# Altium footprint library ICs And Semiconductors THD.PcbLib: 507 footprints (part 8 of 32)
Each footprint in its own frame and in the unit in brackets; x right, y up, seen from the top. Pads: shape width x height; smd on the part's side, far side on the other; paste and mask are expansions set on the pad; w line width, h text height; cw(c..) or ccw(c..) is an arc to the next point about the centre after c.
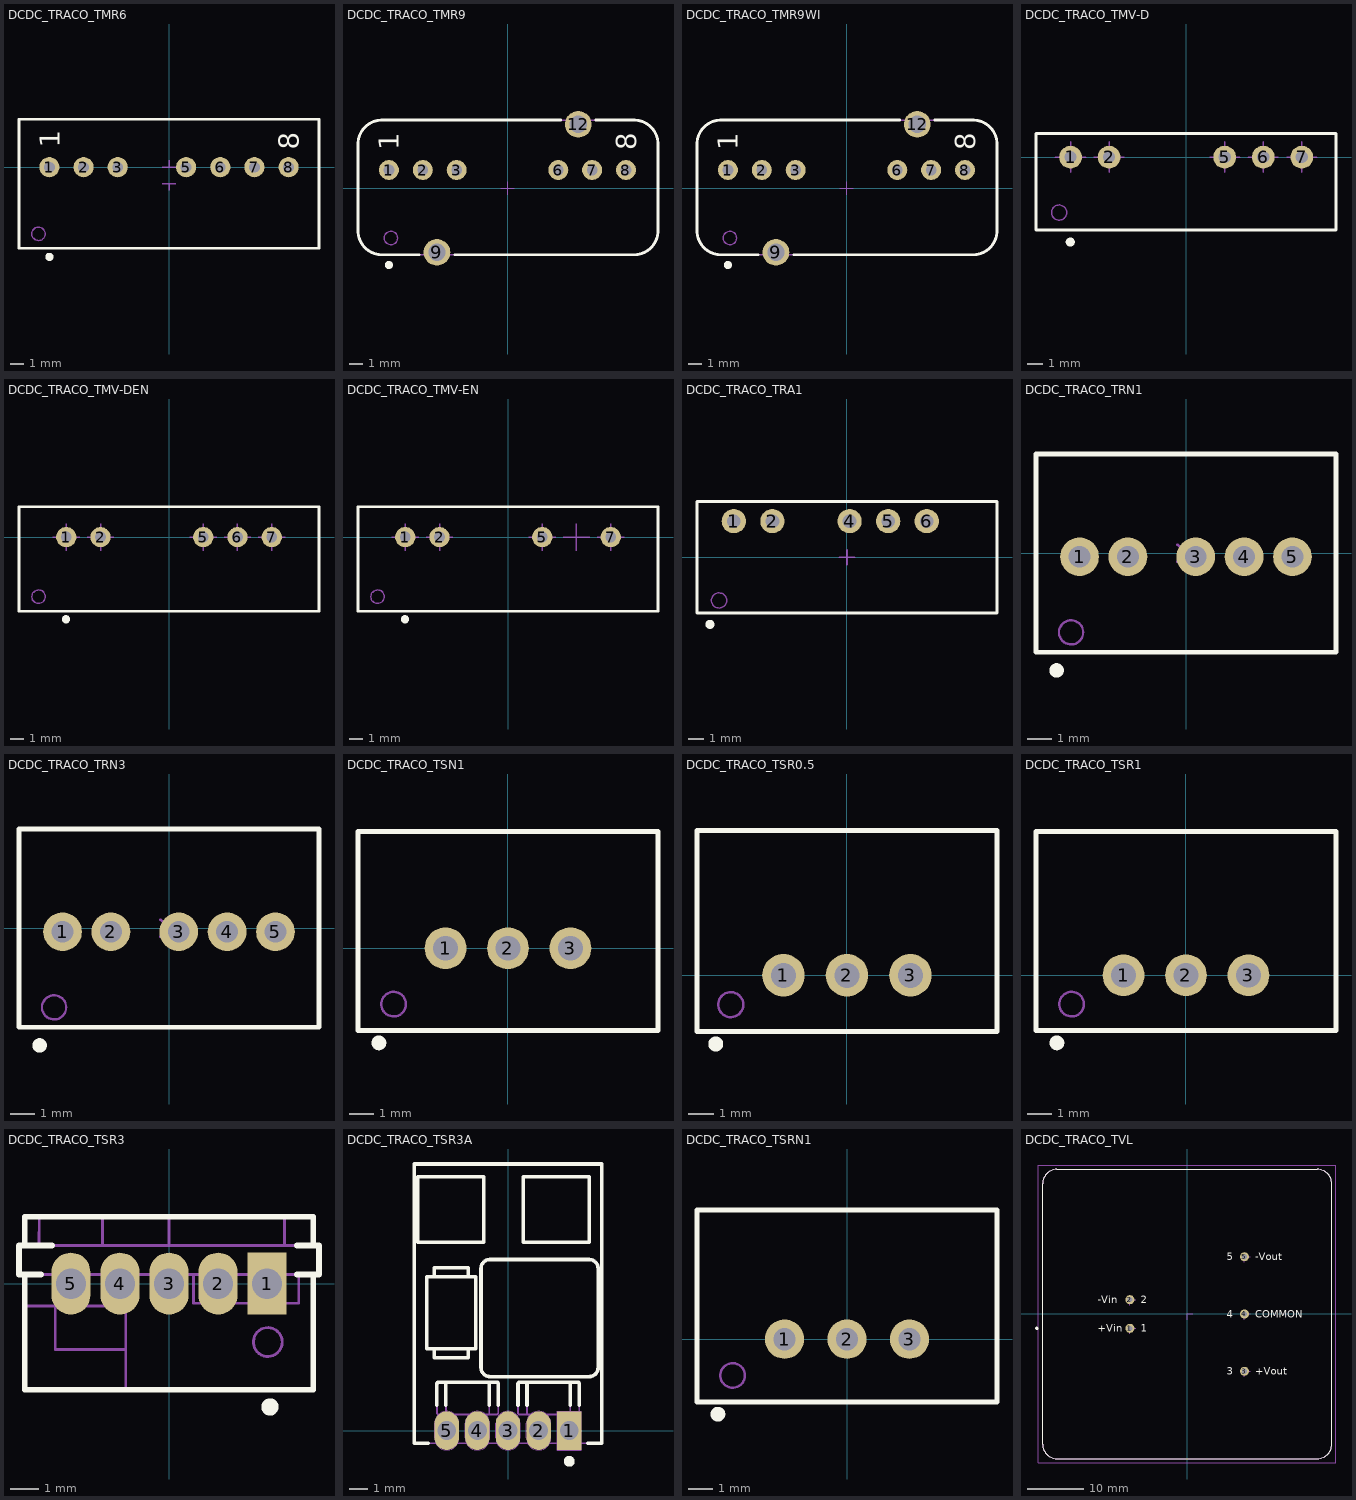
[diagram p7: the footprints below, top view; thin cyan lines are the x and y axes]

## DCDC_TRACO_TMR6 [mm] "TMR 6 Series , Body 21.8x9.1mm, Compact SIP-8 Package"
height 11.2
pads (7):
  round 1.5 hole 0.8: 1(-8.89,0) 2(-6.35,0) 3(-3.81,0) 5(1.27,0) 6(3.81,0) 7(6.35,0) 8(8.89,0)
Top Overlay:
  circle w0.3: c-8.89,-6.667 r0.15
  lines w0.2: -11.15,-6.025 11.15,-6.025 11.15,3.575 -11.15,3.575 -11.15,-6.025
  text "1" at -8.115,1.45 h1.5
  text "8" at 9.64,1.3 h1.5
Notvisible:
  lines w0.1: -9.39,0 -8.89,0 ; -8.89,-0.5 -8.89,0 ; -8.89,0.5 -8.89,0 ; -8.39,0 -8.89,0 ; -6.85,0 -6.35,0 ; -6.35,-0.5 -6.35,0 ; -6.35,0.5 -6.35,0 ; -5.85,0 -6.35,0 ; -4.31,0 -3.81,0 ; -3.81,-0.5 -3.81,0 ; -3.81,0.5 -3.81,0 ; -3.31,0 -3.81,0 ; -0.5,-1.225 0,-1.225 ; -0.5,0 0,0 ; 0,-1.725 0,-1.225 ; 0,0.5 0,0 ; 0.5,-1.225 0,-1.225 ; 0.5,0 0,0 ; 0.77,0 1.27,0 ; 1.27,-0.5 1.27,0 ; 1.27,0.5 1.27,0 ; 1.77,0 1.27,0 ; 3.31,0 3.81,0 ; 3.81,-0.5 3.81,0 ; 3.81,0.5 3.81,0 ; 4.31,0 3.81,0 ; 5.85,0 6.35,0 ; 6.35,-0.5 6.35,0 ; 6.35,0.5 6.35,0 ; 6.85,0 6.35,0 ; 8.39,0 8.89,0 ; 8.89,-0.5 8.89,0 ; 8.89,0.5 8.89,0 ; 9.39,0 8.89,0
  text "2" at -5.6,1.2 h1.5
  text "7" at 7.1,1.2 h1.5
  text "6" at 4.56,1.2 h1.5
  text "5" at 2.02,1.2 h1.5
  text "3" at -3.06,1.2 h1.5
Mechanical 14:
  circle w0.1: c-9.7,-4.95 r0.5
  lines w0.1: -11.15,-6.025 11.15,-6.025 11.15,3.575 -11.15,3.575 -11.15,-6.025
  text "1" at -8.115,1.45 h1.5
  text "8" at 9.64,1.3 h1.5
3D body "DCDC_TRACO_TMR6.stp": height 11.7, standoff -3.6, extent -11.15,-6.025 11.15,3.575

## DCDC_TRACO_TMR9 [mm] "TMR 9 Series, Body 21.8x9.6mm, Compact SIP-8 Package"
height 11.7
pads (8):
  round 1.5 hole 0.8: 1(-8.9,1.375) 2(-6.36,1.375) 3(-3.82,1.375) 6(3.8,1.375) 7(6.34,1.375) 8(8.88,1.375)
  round 2 hole 1.3: 9(-5.3,-4.8) 12(5.3,4.8)
Top Overlay:
  drawing of 407 lines, arcs and shapes, not listed
  text "1" at -8.15,2.875 h1.5
  text "8" at 9.63,2.875 h1.5
Notvisible:
  lines w0.05: -9.4,1.375 -8.9,1.375 ; -8.9,0.875 -8.9,1.375 ; -8.9,1.875 -8.9,1.375 ; -8.4,1.375 -8.9,1.375 ; -6.86,1.375 -6.36,1.375 ; -6.36,0.875 -6.36,1.375 ; -6.36,1.875 -6.36,1.375 ; -5.86,1.375 -6.36,1.375 ; -5.8,-4.8 -5.3,-4.8 ; -5.3,-5.3 -5.3,-4.8 ; -5.3,-4.3 -5.3,-4.8 ; -4.8,-4.8 -5.3,-4.8 ; -4.32,1.375 -3.82,1.375 ; -3.82,0.875 -3.82,1.375 ; -3.82,1.875 -3.82,1.375 ; -3.32,1.375 -3.82,1.375 ; -0.5,0 0,0 ; 0,-0.5 0,0 ; 0,0.5 0,0 ; 0.5,0 0,0 ; 3.3,1.375 3.8,1.375 ; 3.8,0.875 3.8,1.375 ; 3.8,1.875 3.8,1.375 ; 4.3,1.375 3.8,1.375 ; 4.8,4.8 5.3,4.8 ; 5.3,4.3 5.3,4.8 ; 5.3,5.3 5.3,4.8 ; 5.8,4.8 5.3,4.8 ; 5.84,1.375 6.34,1.375 ; 6.34,0.875 6.34,1.375 ; 6.34,1.875 6.34,1.375 ; 6.84,1.375 6.34,1.375 ; 8.38,1.375 8.88,1.375 ; 8.88,0.875 8.88,1.375 ; 8.88,1.875 8.88,1.375 ; 9.38,1.375 8.88,1.375
  text "7" at 7.09,2.875 h1.5
  text "6" at 4.55,2.875 h1.5
  text "3" at -3.07,2.875 h1.5
  text "2" at -5.61,2.875 h1.5
Mechanical 14:
  drawing of 405 lines, arcs and shapes, not listed
  text "1" at -8.15,2.875 h1.5
  text "8" at 9.63,2.875 h1.5
3D body "DCDC_TRACO_TMR9.stp": height 11.7, standoff -4.1, extent -11.22,-5.016 11.28,5.156

## DCDC_TRACO_TMR9WI [mm] "TMR 9 WI Series, Body 21.8x9.6mm, Compact SIP-8 Package"
height 11.7
pads (8):
  round 1.5 hole 0.8: 1(-8.9,1.375) 2(-6.36,1.375) 3(-3.82,1.375) 6(3.8,1.375) 7(6.34,1.375) 8(8.88,1.375)
  round 2 hole 1.3: 9(-5.3,-4.8) 12(5.3,4.8)
Top Overlay:
  drawing of 407 lines, arcs and shapes, not listed
  text "1" at -8.15,2.875 h1.5
  text "8" at 9.63,2.875 h1.5
Notvisible:
  lines w0.05: -9.4,1.375 -8.9,1.375 ; -8.9,0.875 -8.9,1.375 ; -8.9,1.875 -8.9,1.375 ; -8.4,1.375 -8.9,1.375 ; -6.86,1.375 -6.36,1.375 ; -6.36,0.875 -6.36,1.375 ; -6.36,1.875 -6.36,1.375 ; -5.86,1.375 -6.36,1.375 ; -5.8,-4.8 -5.3,-4.8 ; -5.3,-5.3 -5.3,-4.8 ; -5.3,-4.3 -5.3,-4.8 ; -4.8,-4.8 -5.3,-4.8 ; -4.32,1.375 -3.82,1.375 ; -3.82,0.875 -3.82,1.375 ; -3.82,1.875 -3.82,1.375 ; -3.32,1.375 -3.82,1.375 ; -0.5,0 0,0 ; 0,-0.5 0,0 ; 0,0.5 0,0 ; 0.5,0 0,0 ; 3.3,1.375 3.8,1.375 ; 3.8,0.875 3.8,1.375 ; 3.8,1.875 3.8,1.375 ; 4.3,1.375 3.8,1.375 ; 4.8,4.8 5.3,4.8 ; 5.3,4.3 5.3,4.8 ; 5.3,5.3 5.3,4.8 ; 5.8,4.8 5.3,4.8 ; 5.84,1.375 6.34,1.375 ; 6.34,0.875 6.34,1.375 ; 6.34,1.875 6.34,1.375 ; 6.84,1.375 6.34,1.375 ; 8.38,1.375 8.88,1.375 ; 8.88,0.875 8.88,1.375 ; 8.88,1.875 8.88,1.375 ; 9.38,1.375 8.88,1.375
  text "7" at 7.09,2.875 h1.5
  text "6" at 4.55,2.875 h1.5
  text "3" at -3.07,2.875 h1.5
  text "2" at -5.61,2.875 h1.5
Mechanical 14:
  drawing of 405 lines, arcs and shapes, not listed
  text "1" at -8.15,2.875 h1.5
  text "8" at 9.63,2.875 h1.5
3D body "DCDC_TRACO_TMR9WI.stp": height 11.7, standoff -4.1, extent -11.22,-5.016 11.28,5.155

## DCDC_TRACO_TMV-D [mm] "TMV Series, Dual Output DC/DC Converter,  Body 19.5x6.1mm"
height 10.45
pads (5):
  round 1.5 hole 0.8: 1(-7.62,0) 2(-5.08,0) 5(2.54,0) 6(5.08,0) 7(7.62,0)
Top Overlay:
  circle w0.3: c-7.643,-5.596 r0.15
  lines w0.2: -9.9,-4.8 -9.9,1.55 9.875,1.55 9.875,-4.8 -9.9,-4.8
Notvisible:
  lines w0.1: -8.62,0 -7.62,0 ; -7.62,-1 -7.62,0 ; -7.62,1 -7.62,0 ; -6.62,0 -7.62,0 ; -6.08,0 -5.08,0 ; -5.08,-1 -5.08,0 ; -5.08,1 -5.08,0 ; -4.08,0 -5.08,0 ; 1.54,0 2.54,0 ; 2.54,-1 2.54,0 ; 2.54,1 2.54,0 ; 3.54,0 2.54,0 ; 4.08,0 5.08,0 ; 5.08,-1 5.08,0 ; 5.08,1 5.08,0 ; 6.08,0 5.08,0 ; 6.62,0 7.62,0 ; 7.62,-1 7.62,0 ; 7.62,1 7.62,0 ; 8.62,0 7.62,0
Mechanical 14:
  circle w0.1: c-8.375,-3.65 r0.5
  lines w0.1: -9.9,-4.8 -9.9,1.55 9.875,1.55 9.875,-4.8 -9.9,-4.8
  text "1" at -6.87,-2.03 h1.5
  text "7" at 8.382,-2.159 h1.5
Mechanical 15:
  lines w0.1: -8.62,0 -7.62,0 ; -7.62,-1 -7.62,0 ; -7.62,1 -7.62,0 ; -6.62,0 -7.62,0 ; -6.08,0 -5.08,0 ; -5.08,-1 -5.08,0 ; -5.08,1 -5.08,0 ; -4.08,0 -5.08,0 ; 1.54,0 2.54,0 ; 2.54,-1 2.54,0 ; 2.54,1 2.54,0 ; 3.54,0 2.54,0 ; 4.08,0 5.08,0 ; 5.08,-1 5.08,0 ; 5.08,1 5.08,0 ; 6.08,0 5.08,0
3D body "DCDC_TRACO_TMV-D.stp": height 10.45, standoff -3.5, extent -9.875,-4.8 9.875,1.55

## DCDC_TRACO_TMV-DEN [mm] "TMV Series, Dual Output DC/DC Converter,  Body 22x7.5mm"
height 12.75
pads (5):
  round 1.5 hole 0.8: 1(-7.62,0) 2(-5.08,0) 5(2.54,0) 6(5.08,0) 7(7.62,0)
Top Overlay:
  circle w0.3: c-7.643,-6.096 r0.15
  lines w0.2: -11.125,-5.5 -11.125,2.25 11.125,2.25 11.125,-5.5 -11.125,-5.5
Notvisible:
  lines w0.1: -8.62,0 -7.62,0 ; -7.62,-1 -7.62,0 ; -7.62,1 -7.62,0 ; -6.62,0 -7.62,0 ; -6.08,0 -5.08,0 ; -5.08,-1 -5.08,0 ; -5.08,1 -5.08,0 ; -4.08,0 -5.08,0 ; 1.54,0 2.54,0 ; 2.54,-1 2.54,0 ; 2.54,1 2.54,0 ; 3.54,0 2.54,0 ; 4.08,0 5.08,0 ; 5.08,-1 5.08,0 ; 5.08,1 5.08,0 ; 6.08,0 5.08,0 ; 6.62,0 7.62,0 ; 7.62,-1 7.62,0 ; 7.62,1 7.62,0 ; 8.62,0 7.62,0
Mechanical 14:
  circle w0.1: c-9.675,-4.425 r0.5
  lines w0.1: -11.125,-5.5 -11.125,2.25 11.125,2.25 11.125,-5.5 -11.125,-5.5
  text "1" at -6.87,-2.03 h1.5
  text "7" at 8.382,-2.159 h1.5
Mechanical 15:
  lines w0.1: -8.62,0 -7.62,0 ; -7.62,-1 -7.62,0 ; -7.62,1 -7.62,0 ; -6.62,0 -7.62,0 ; -6.08,0 -5.08,0 ; -5.08,-1 -5.08,0 ; -5.08,1 -5.08,0 ; -4.08,0 -5.08,0 ; 1.54,0 2.54,0 ; 2.54,-1 2.54,0 ; 2.54,1 2.54,0 ; 3.54,0 2.54,0 ; 4.08,0 5.08,0 ; 5.08,-1 5.08,0 ; 5.08,1 5.08,0 ; 6.08,0 5.08,0
3D body "DCDC_TRACO_TMV-DEN.stp": height 12.75, standoff -3.5, extent -11.125,-5.5 11.125,2.25

## DCDC_TRACO_TMV-EN [mm] "TMV Series, Single Output DC/DC Converter,  Body 22x7.5mm"
height 12.75
pads (4):
  round 1.5 hole 0.8: 1(-7.62,0) 2(-5.08,0) 5(2.54,0) 7(7.62,0)
Top Overlay:
  circle w0.3: c-7.643,-6.096 r0.15
  lines w0.2: -11.125,-5.5 -11.125,2.25 11.125,2.25 11.125,-5.5 -11.125,-5.5
Notvisible:
  lines w0.1: -8.62,0 -7.62,0 ; -7.62,-1 -7.62,0 ; -7.62,1 -7.62,0 ; -6.62,0 -7.62,0 ; -6.08,0 -5.08,0 ; -5.08,-1 -5.08,0 ; -5.08,1 -5.08,0 ; -4.08,0 -5.08,0 ; 1.54,0 2.54,0 ; 2.54,-1 2.54,0 ; 2.54,1 2.54,0 ; 3.54,0 2.54,0 ; 4.08,0 5.08,0 ; 5.08,-1 5.08,0 ; 5.08,1 5.08,0 ; 6.08,0 5.08,0 ; 6.62,0 7.62,0 ; 7.62,-1 7.62,0 ; 7.62,1 7.62,0 ; 8.62,0 7.62,0
Mechanical 14:
  circle w0.1: c-9.675,-4.425 r0.5
  lines w0.1: -11.125,-5.5 -11.125,2.25 11.125,2.25 11.125,-5.5 -11.125,-5.5
  text "1" at -6.87,-2.03 h1.5
  text "7" at 8.382,-2.159 h1.5
Mechanical 15:
  lines w0.1: -8.62,0 -7.62,0 ; -7.62,-1 -7.62,0 ; -7.62,1 -7.62,0 ; -6.62,0 -7.62,0 ; -6.08,0 -5.08,0 ; -5.08,-1 -5.08,0 ; -5.08,1 -5.08,0 ; -4.08,0 -5.08,0 ; 1.54,0 2.54,0 ; 2.54,-1 2.54,0 ; 2.54,1 2.54,0 ; 3.54,0 2.54,0
3D body "DCDC_TRACO_TMV-EN.stp": height 12.75, standoff -3.5, extent -11.125,-5.5 11.125,2.25

## DCDC_TRACO_TRA1 [mm] "TRA1 Series , Body 19.5x7.1mm"
height 10.2
pads (5):
  round 1.6 hole 0.9: 1(-7.45,2.375) 2(-4.91,2.375) 4(0.17,2.375) 5(2.71,2.375) 6(5.25,2.375)
Top Overlay:
  circle w0.3: c-9.025,-4.425 r0.15
  lines w0.2: -9.875,-3.675 9.875,-3.675 9.875,3.675 -9.875,3.675 -9.875,-3.675
Notvisible:
  lines w0.1: -7.95,2.375 -7.45,2.375 ; -7.45,1.875 -7.45,2.375 ; -7.45,2.875 -7.45,2.375 ; -6.95,2.375 -7.45,2.375 ; -5.41,2.375 -4.91,2.375 ; -4.91,1.875 -4.91,2.375 ; -4.91,2.875 -4.91,2.375 ; -4.41,2.375 -4.91,2.375 ; -0.5,0 0,0 ; -0.33,2.375 0.17,2.375 ; 0,-0.5 0,0 ; 0,0.5 0,0 ; 0.17,1.875 0.17,2.375 ; 0.17,2.875 0.17,2.375 ; 0.5,0 0,0 ; 0.67,2.375 0.17,2.375 ; 2.21,2.375 2.71,2.375 ; 2.71,1.875 2.71,2.375 ; 2.71,2.875 2.71,2.375 ; 3.21,2.375 2.71,2.375 ; 4.75,2.375 5.25,2.375 ; 5.25,1.875 5.25,2.375 ; 5.25,2.875 5.25,2.375 ; 5.75,2.375 5.25,2.375
Mechanical 14:
  circle w0.1: c-8.425,-2.85 r0.5
  lines w0.1: -9.875,-3.675 9.875,-3.675 9.875,3.675 -9.875,3.675 -9.875,-3.675
3D body "DCDC_TRACO_TRA1.stp": height 10.45, standoff -3.6, extent -9.875,-3.675 9.875,3.675

## DCDC_TRACO_TRN1 [mm] "TRN 1 Series , Body 11.9 x 7.7mm"
height 11.5
pads (5):
  round 1.6 hole 0.9: 1(-4.4,-0.15) 2(-2.4,-0.15) 3(0.4,-0.15) 4(2.4,-0.15) 5(4.4,-0.15)
Top Overlay:
  circle w0.3: c-5.35,-4.85 r0.15
  lines w0.2: -6.2,-4.1 6.2,-4.1 6.2,4.1 -6.2,4.1 -6.2,-4.1
Notvisible:
  lines w0.1: -4.9,-0.15 -4.4,-0.15 ; -4.4,-0.65 -4.4,-0.15 ; -4.4,0.35 -4.4,-0.15 ; -3.9,-0.15 -4.4,-0.15 ; -2.9,-0.15 -2.4,-0.15 ; -2.4,-0.65 -2.4,-0.15 ; -2.4,0.35 -2.4,-0.15 ; -1.9,-0.15 -2.4,-0.15 ; -0.354,-0.354 0,0 ; -0.354,0.354 0,0 ; -0.1,-0.15 0.4,-0.15 ; 0.354,-0.354 0,0 ; 0.354,0.354 0,0 ; 0.4,-0.65 0.4,-0.15 ; 0.4,0.35 0.4,-0.15 ; 0.9,-0.15 0.4,-0.15 ; 1.9,-0.15 2.4,-0.15 ; 2.4,-0.65 2.4,-0.15 ; 2.4,0.35 2.4,-0.15 ; 2.9,-0.15 2.4,-0.15 ; 3.9,-0.15 4.4,-0.15 ; 4.4,-0.65 4.4,-0.15 ; 4.4,0.35 4.4,-0.15 ; 4.9,-0.15 4.4,-0.15
Mechanical 14:
  circle w0.1: c-4.75,-3.275 r0.5
  lines w0.1: -6.2,-4.1 6.2,-4.1 6.2,4.1 -6.2,4.1 -6.2,-4.1
3D body "DCDC_TRACO_TRN1.stp": height 11.5, standoff -3.6, extent -6.2,-4.1 6.2,4.1

## DCDC_TRACO_TRN3 [mm] "TRN 3 Series , Body 11.9 x 7.7mm"
height 11.5
pads (5):
  round 1.6 hole 0.9: 1(-4.4,-0.15) 2(-2.4,-0.15) 3(0.4,-0.15) 4(2.4,-0.15) 5(4.4,-0.15)
Top Overlay:
  circle w0.3: c-5.35,-4.85 r0.15
  lines w0.2: -6.2,-4.1 -6.2,4.1 6.2,4.1 6.2,-4.1 -6.2,-4.1
Notvisible:
  lines w0.1: -4.9,-0.15 -4.4,-0.15 ; -4.4,-0.65 -4.4,-0.15 ; -4.4,0.35 -4.4,-0.15 ; -3.9,-0.15 -4.4,-0.15 ; -2.9,-0.15 -2.4,-0.15 ; -2.4,-0.65 -2.4,-0.15 ; -2.4,0.35 -2.4,-0.15 ; -1.9,-0.15 -2.4,-0.15 ; -0.354,-0.354 0,0 ; -0.354,0.354 0,0 ; -0.1,-0.15 0.4,-0.15 ; 0.354,-0.354 0,0 ; 0.354,0.354 0,0 ; 0.4,-0.65 0.4,-0.15 ; 0.4,0.35 0.4,-0.15 ; 0.9,-0.15 0.4,-0.15 ; 1.9,-0.15 2.4,-0.15 ; 2.4,-0.65 2.4,-0.15 ; 2.4,0.35 2.4,-0.15 ; 2.9,-0.15 2.4,-0.15 ; 3.9,-0.15 4.4,-0.15 ; 4.4,-0.65 4.4,-0.15 ; 4.4,0.35 4.4,-0.15 ; 4.9,-0.15 4.4,-0.15
Mechanical 14:
  circle w0.1: c-4.75,-3.275 r0.5
  lines w0.1: -6.2,-4.1 -6.2,4.1 6.2,4.1 6.2,-4.1 -6.2,-4.1
3D body "DCDC_TRACO_TRN3.stp": height 11.5, standoff -3.6, extent -6.2,-4.1 6.2,4.1

## DCDC_TRACO_TSN1 [mm] "TSN 1 Series, Single Output DC/DC Converter,  Body 11.7x7.5mm"
height 17
pads (3):
  round 1.7 hole 1: 1(-2.54,0) 2(0,0) 3(2.54,0)
Top Overlay:
  circle w0.3: c-5.25,-3.85 r0.15
  lines w0.2: -6.1,-3.35 -6.1,4.75 6.1,4.75 6.1,-3.35 -6.1,-3.35
Notvisible:
  lines w0.1: -3.04,0 -2.54,0 ; -2.54,-0.5 -2.54,0 ; -2.54,0.5 -2.54,0 ; -2.04,0 -2.54,0 ; -0.5,0 0,0 ; 0,-0.5 0,0 ; 0,0.5 0,0 ; 0.5,0 0,0 ; 2.04,0 2.54,0 ; 2.54,-0.5 2.54,0 ; 2.54,0.5 2.54,0 ; 3.04,0 2.54,0
Mechanical 14:
  circle w0.1: c-4.65,-2.275 r0.5
  lines w0.1: -6.1,-3.35 -6.1,4.75 6.1,4.75 6.1,-3.35 -6.1,-3.35
3D body "DCDC_TRACO_TSN1.stp": height 17, standoff -3.6, extent -6.1,-3.35 6.1,4.75

## DCDC_TRACO_TSR0.5 [mm] "TSR 0.5 Series, Single Output DC/DC Converter,  Body 11.5x7.55mm"
height 10.7
pads (3):
  round 1.7 hole 1: 1(-2.54,0) 2(0,0) 3(2.54,0)
Top Overlay:
  circle w0.3: c-5.25,-2.75 r0.15
  lines w0.2: -6,-2.25 6,-2.25 6,5.8 -6,5.8 -6,-2.25
Notvisible:
  lines w0.1: -3.04,0 -2.54,0 ; -2.54,-0.5 -2.54,0 ; -2.54,0.5 -2.54,0 ; -2.04,0 -2.54,0 ; -0.5,0 0,0 ; 0,-0.5 0,0 ; 0,0.5 0,0 ; 0.5,0 0,0 ; 2.04,0 2.54,0 ; 2.54,-0.5 2.54,0 ; 2.54,0.5 2.54,0 ; 3.04,0 2.54,0
Mechanical 14:
  circle w0.1: c-4.65,-1.175 r0.5
  lines w0.1: -6,-2.25 6,-2.25 6,5.8 -6,5.8 -6,-2.25
3D body "DCDC_TRACO_TSR0.5.stp": height 10.7, standoff -3.6, extent -6,-2.25 6,5.8

## DCDC_TRACO_TSR1 [mm] "TMV Series, Single Output DC/DC Converter,  Body 22x7.5mm"
height 12.75
pads (3):
  round 1.7 hole 1: 1(-2.54,0) 2(0,0) 3(2.54,0)
Top Overlay:
  circle w0.3: c-5.25,-2.75 r0.15
  lines w0.2: -6.1,-2.25 -6.1,5.85 6.1,5.85 6.1,-2.25 -6.1,-2.25
Notvisible:
  lines w0.1: -3.04,0 -2.54,0 ; -2.54,-0.5 -2.54,0 ; -2.54,0.5 -2.54,0 ; -2.04,0 -2.54,0 ; -0.5,0 0,0 ; 0,-0.5 0,0 ; 0,0.5 0,0 ; 0.5,0 0,0 ; 2.04,0 2.54,0 ; 2.54,-0.5 2.54,0 ; 2.54,0.5 2.54,0 ; 3.04,0 2.54,0
Mechanical 14:
  circle w0.1: c-4.65,-1.175 r0.5
  lines w0.1: -6.1,-2.25 -6.1,5.85 6.1,5.85 6.1,-2.25 -6.1,-2.25
3D body "DCDC_TRACO_TSR1.stp": height 10.7, standoff -3.6, extent -6.1,-2.25 6.1,5.85

## DCDC_TRACO_TSR3 [mm] "TRACO TSR-3, DC/DC Converter,  Body W 6mm x L 10.4mm x H 15.5mm"
height 16
pads (5):
  rect 1.35x2.15 hole 1.05: 1(3.4,0)
  oval 1.35x2.15 hole 1.05: 2(1.7,0) 3(0,0) 4(-1.7,0) 5(-3.4,0)
Top Overlay:
  circle w0.3: c3.5,-4.275 r0.15
  lines w0.2: -5,0.32 -5,-3.68 5,-3.68 5,0.32 ; -5,1.32 -5,2.32 5,2.32 5,1.32 ; -4.436,0.32 -5.2,0.32 -5.2,1.32 -4.058,1.32 ; 4.436,0.32 5.2,0.32 5.2,1.32 4.436,1.32
Notvisible:
  lines w0.1: -3.9,0 -3.4,0 ; -3.4,-0.5 -3.4,0 ; -3.4,0.5 -3.4,0 ; -2.9,0 -3.4,0 ; -2.2,0 -1.7,0 ; -1.7,-0.5 -1.7,0 ; -1.7,0.5 -1.7,0 ; -1.2,0 -1.7,0 ; -0.5,0 0,0 ; 0,-0.5 0,0 ; 0,0.5 0,0 ; 0.5,0 0,0 ; 1.2,0 1.7,0 ; 1.7,-0.5 1.7,0 ; 1.7,0.5 1.7,0 ; 2.2,0 1.7,0 ; 2.9,0 3.4,0 ; 3.4,-0.5 3.4,0 ; 3.4,0.5 3.4,0 ; 3.9,0 3.4,0
Mechanical 14:
  circle w0.1: c3.425,-2.025 r0.5
  lines w0.1: -5.001,0.32 -5.001,-0.78 -1.35,-0.78 -1.35,0.32 ; -4.5,1.32 -4.5,2.32 -2.3,2.32 -2.3,1.32 ; -3.944,-0.78 -3.944,-2.28 -1.5,-2.28 ; -1.5,-3.68 5,-3.68 5,0.32 ; -1.5,-3.63 -1.5,-0.78 ; 0,1.32 0,2.32 4,2.32 4,1.32 ; 0.856,0.32 0.856,-0.68 4.5,-0.68 4.5,0.32 ; -5.2,0.32 -5.2,1.32 5.2,1.32 5.2,0.32 -5.2,0.32
3D body "DCDC_TRACO_TSR3.stp": height 15.5, standoff -3.3, extent -5.2,-3.68 5.2,2.32

## DCDC_TRACO_TSR3A [mm] "TRACO TSR-3, Angular Pin Version, DC/DC Converter, Body W 10.4mm x L 15.5mm"
height 7.2
pads (5):
  rect 1.35x2.15 hole 1.05: 1(3.4,0)
  oval 1.35x2.15 hole 1.05: 2(1.7,0) 3(0,0) 4(-1.7,0) 5(-3.4,0)
Top Overlay:
  circle w0.3: c3.4,-1.7 r0.15
  lines w0.2: -4.425,-0.7 -5.2,-0.7 -5.2,14.8 5.2,14.8 5.2,-0.7 4.425,-0.7 ; -4.1,4.55 -4.1,4.05 -2.2,4.05 -2.2,4.55 ; -4.1,8.55 -4.1,9.05 -2.2,9.05 -2.2,8.55 ; -3.944,1.425 -3.944,2.594 cw(c-3.844,2.594) -3.844,2.694 -0.644,2.694 cw(c-0.644,2.594) -0.544,2.594 -0.544,1.425 ; -3.444,1.425 -3.444,2.694 ; -1.044,1.425 -1.044,2.694 ; 0.556,1.425 0.556,2.594 cw(c0.656,2.594) 0.656,2.694 3.856,2.694 cw(c3.856,2.594) 3.956,2.594 3.956,1.425 ; 1.056,1.425 1.056,2.694 ; 3.456,1.425 3.456,2.694 ; -5,10.45 -1.35,10.45 -1.35,14.1 -5,14.1 -5,10.45 ; -4.5,4.55 -1.8,4.55 -1.8,8.55 -4.5,8.55 -4.5,4.55 ; -1.5,3.5 ccw(c-1,3.5) -1,3 4.5,3 ccw(c4.5,3.5) 5,3.5 5,9 ccw(c4.5,9) 4.5,9.5 -1,9.5 ccw(c-1,9) -1.5,9 -1.5,3.5 ; 0.85,10.45 4.5,10.45 4.5,14.1 0.85,14.1 0.85,10.45
Notvisible:
  circle w0.05: c-3.4,0 r0.525
  circle w0.05: c-1.7,0 r0.525
  circle w0.05: c0,0 r0.525
  circle w0.05: c1.7,0 r0.525
  circle w0.05: c3.4,0 r0.525
  lines w0.05: -3.9,0 -3.4,0 ; -3.4,-0.5 -3.4,0 ; -3.4,0.5 -3.4,0 ; -2.9,0 -3.4,0 ; -2.2,0 -1.7,0 ; -1.7,-0.5 -1.7,0 ; -1.7,0.5 -1.7,0 ; -1.2,0 -1.7,0 ; -0.5,0 0,0 ; 0,-0.5 0,0 ; 0,0.5 0,0 ; 0.5,0 0,0 ; 1.2,0 1.7,0 ; 1.7,-0.5 1.7,0 ; 1.7,0.5 1.7,0 ; 2.2,0 1.7,0 ; 2.9,0 3.4,0 ; 3.4,-0.5 3.4,0 ; 3.4,0.5 3.4,0 ; 3.9,0 3.4,0 ; -4.075,-0.4 ccw(c-3.4,-0.4) -2.725,-0.4 -2.725,0.4 ccw(c-3.4,0.4) -4.075,0.4 -4.075,-0.4 ; -2.375,-0.4 ccw(c-1.7,-0.4) -1.025,-0.4 -1.025,0.4 ccw(c-1.7,0.4) -2.375,0.4 -2.375,-0.4 ; -0.675,-0.4 ccw(c0,-0.4) 0.675,-0.4 0.675,0.4 ccw(c0,0.4) -0.675,0.4 -0.675,-0.4 ; 1.025,-0.4 ccw(c1.7,-0.4) 2.375,-0.4 2.375,0.4 ccw(c1.7,0.4) 1.025,0.4 1.025,-0.4 ; 2.725,-1.075 2.725,1.075 4.075,1.075 4.075,-1.075 2.725,-1.075
Mechanical 14:
  lines w0.1: -4.1,4.55 -4.1,4.05 -2.2,4.05 -2.2,4.55 ; -4.1,8.55 -4.1,9.05 -2.2,9.05 -2.2,8.55 ; -3.444,0.894 -3.444,2.694 ; -1.044,0.894 -1.044,2.694 ; 1.056,0.894 1.056,2.694 ; 3.456,0.894 3.456,2.694 ; -5.2,-0.7 5.2,-0.7 5.2,14.8 -5.2,14.8 -5.2,-0.7 ; -5,10.45 -1.35,10.45 -1.35,14.1 -5,14.1 -5,10.45 ; -4.5,4.55 -1.8,4.55 -1.8,8.55 -4.5,8.55 -4.5,4.55 ; -3.944,0.994 ccw(c-3.844,0.994) -3.844,0.894 -0.644,0.894 ccw(c-0.644,0.994) -0.544,0.994 -0.544,2.594 ccw(c-0.644,2.594) -0.644,2.694 -3.844,2.694 ccw(c-3.844,2.594) -3.944,2.594 -3.944,0.994 ; -3.72,-0.32 -3.08,-0.32 -3.08,0.32 -3.72,0.32 -3.72,-0.32 ; -2.02,-0.32 -1.38,-0.32 -1.38,0.32 -2.02,0.32 -2.02,-0.32 ; -1.5,3.5 ccw(c-1,3.5) -1,3 4.5,3 ccw(c4.5,3.5) 5,3.5 5,9 ccw(c4.5,9) 4.5,9.5 -1,9.5 ccw(c-1,9) -1.5,9 -1.5,3.5 ; -0.32,-0.32 -0.32,0.32 0.32,0.32 0.32,-0.32 -0.32,-0.32 ; 0.556,0.994 ccw(c0.656,0.994) 0.656,0.894 3.856,0.894 ccw(c3.856,0.994) 3.956,0.994 3.956,2.594 ccw(c3.856,2.594) 3.856,2.694 0.656,2.694 ccw(c0.656,2.594) 0.556,2.594 0.556,0.994 ; 0.85,10.45 4.5,10.45 4.5,14.1 0.85,14.1 0.85,10.45 ; 1.38,-0.32 2.02,-0.32 2.02,0.32 1.38,0.32 1.38,-0.32 ; 3.08,-0.32 3.72,-0.32 3.72,0.32 3.08,0.32 3.08,-0.32
3D body "DCDC_TRACO_TSR3A.stp": height 7.2, standoff -4.1, extent -5.2,-0.7 5.2,14.8

## DCDC_TRACO_TSRN1 [mm] "TSRN 1 Series, 1 A Switching DC/DC Converter, Body 11.7x7.5mm"
height 10.6
pads (3):
  round 1.6 hole 0.9: 1(-2.54,0) 2(0,0) 3(2.54,0)
Top Overlay:
  circle w0.3: c-5.25,-3.05 r0.15
  lines w0.2: -6.1,-2.55 6.1,-2.55 6.1,5.25 -6.1,5.25 -6.1,-2.55
Notvisible:
  lines w0.05: -3.04,0 -2.54,0 ; -2.54,-0.5 -2.54,0 ; -2.54,0.5 -2.54,0 ; -2.04,0 -2.54,0 ; -0.5,0 0,0 ; 0,-0.5 0,0 ; 0,0.5 0,0 ; 0.5,0 0,0 ; 2.04,0 2.54,0 ; 2.54,-0.5 2.54,0 ; 2.54,0.5 2.54,0 ; 3.04,0 2.54,0
Mechanical 14:
  circle w0.1: c-4.65,-1.475 r0.5
  lines w0.1: -6.1,-2.55 6.1,-2.55 6.1,5.25 -6.1,5.25 -6.1,-2.55
3D body "DCDC_TRACO_TSRN1.stp": height 10.6, standoff -3.6, extent -6.1,-2.55 6.1,5.25

## DCDC_TRACO_TVL [mm] "TVL Series , Body 51.3x51.3mm"
height 9.8
pads (5):
  round 1.6 hole 0.9: 1(-10.16,-2.54) 2(-10.16,2.54) 3(10.16,-10.16) 4(10.16,0) 5(10.16,10.16)
Top Overlay:
  circle w0.3: c-26.67,-2.54 r0.15
  lines w0.2: -25.65,-23.11 ccw(c-23.11,-23.11) -23.11,-25.65 23.11,-25.65 ccw(c23.11,-23.11) 25.65,-23.11 25.65,23.11 ccw(c23.11,23.11) 23.11,25.65 -23.11,25.65 ccw(c-23.11,23.11) -25.65,23.11 -25.65,-23.11
  text "+Vin" at -15.875,-3.175 h1.27
  text "+Vout" at 12.065,-10.795 h1.27
  text "3" at 6.985,-10.795 h1.27
  text "2" at -8.255,1.905 h1.27
  text "1" at -8.255,-3.175 h1.27
  text "5" at 6.985,9.525 h1.27
  text "4" at 6.985,-0.635 h1.27
  text "-Vin" at -15.875,1.905 h1.27
  text "COMMON" at 12.065,-0.635 h1.27
  text "-Vout" at 12.065,9.525 h1.27
Notvisible:
  circle w0.1: c10.16,-10.16 r0.3
  circle w0.1: c10.16,0 r0.3
  circle w0.1: c10.16,10.16 r0.3
  circle w0.1: c-10.16,2.54 r0.3
  circle w0.1: c-10.16,2.54 r0.5
  circle w0.1: c10.16,-10.16 r0.5
  circle w0.1: c10.16,0 r0.5
  circle w0.1: c10.16,10.16 r0.5
  lines w0.1: -10.16,-3.54 -10.16,-2.54 -9.16,-2.54 ; -10.16,1.54 -10.16,2.54 -9.16,2.54 ; 0,-1 0,0 1,0 ; 10.16,-11.16 10.16,-10.16 11.16,-10.16 ; 10.16,-1 10.16,0 11.16,0 ; 10.16,9.16 10.16,10.16 11.16,10.16 ; -10.66,-2.54 ccw(c-10.16,-2.54) -10.16,-3.04 ccw(c-10.16,-2.54) -9.66,-2.54 ccw(c-10.16,-2.54) -10.16,-2.04 ccw(c-10.16,-2.54) -10.66,-2.54 ; -10.46,-2.54 ccw(c-10.16,-2.54) -10.16,-2.84 ccw(c-10.16,-2.54) -9.86,-2.54 ccw(c-10.16,-2.54) -10.16,-2.24 ccw(c-10.16,-2.54) -10.46,-2.54
Mechanical 14:
  lines w0.1: -25.65,-23.11 ccw(c-23.11,-23.11) -23.11,-25.65 23.11,-25.65 ccw(c23.11,-23.11) 25.65,-23.11 25.65,23.11 ccw(c23.11,23.11) 23.11,25.65 -23.11,25.65 ccw(c-23.11,23.11) -25.65,23.11 -25.65,-23.11
  text "+Vin" at -15.875,-3.175 h1.27
  text "+Vout" at 12.065,-10.795 h1.27
  text "3" at 6.985,-10.795 h1.27
  text "2" at -8.255,1.905 h1.27
  text "1" at -8.255,-3.175 h1.27
  text "5" at 6.985,9.525 h1.27
  text "4" at 6.985,-0.635 h1.27
  text "-Vin" at -15.875,1.905 h1.27
  text "COMMON" at 12.065,-0.635 h1.27
  text "-Vout" at 12.065,9.525 h1.27
Mechanical 15:
  lines w0.05: -26.4,-26.4 -26.4,26.4 26.4,26.4 26.4,-26.4 -26.4,-26.4
3D body "DCDC_TRACO_TVL.stp": height 9.8, standoff -4.2, extent -25.65,-25.65 25.65,25.65